# Altium footprint library Connectors.PcbLib: 114 footprints (part 3 of 8)
Each footprint in its own frame and in the unit in brackets; x right, y up, seen from the top. Pads: shape width x height; smd on the part's side, far side on the other; paste and mask are expansions set on the pad; w line width, h text height; cw(c..) or ccw(c..) is an arc to the next point about the centre after c.
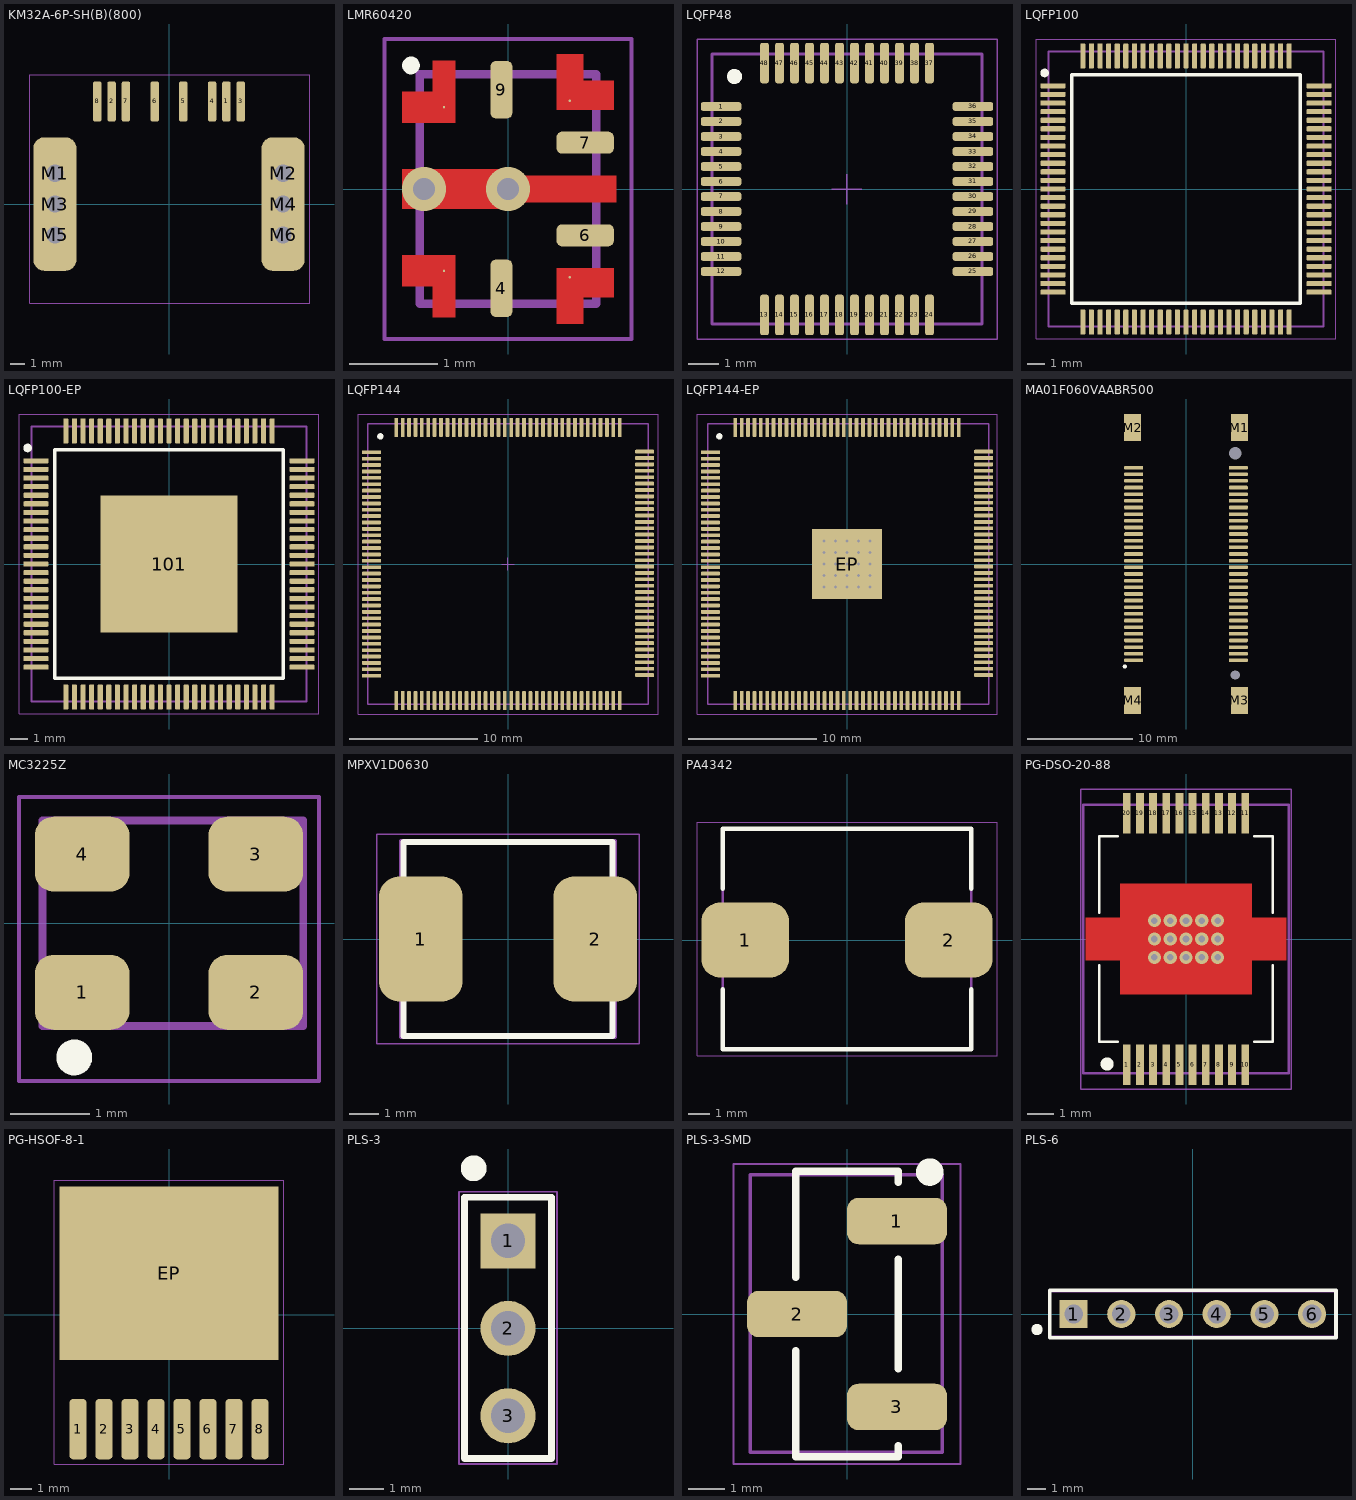
[diagram p2: the footprints below, top view; thin cyan lines are the x and y axes]

## KM32A-6P-SH(B)(800) [mm]
height 8.34
pads (14):
  rrect50% 0.6x2.8 smd: 1(4,7.15) 2(-4,7.15) 3(5,7.15) 4(3,7.15) 5(1,7.15) 6(-1,7.15) 7(-3,7.15) 8(-5,7.15)
  rrect50% 3x5 hole 1.2: M1(-7.95,2.15) M2(7.95,2.15) M3(-7.95,0) M4(7.95,0) M5(-7.95,-2.15) M6(7.95,-2.15)
Mechanical 15:
  lines w0.05: -9.7,-6.9 9.8,-6.9 9.8,9 -9.7,9 -9.7,-6.9
3D body "õqÉŠŒpZE05-8DP-2H.stp": height 8.84, standoff -2.1, extent -9.26,-6.6 9.26,8.2

## LMR60420 [mm] "9-PowerWQFN 2.5X2mm"
height 0.8
pads (9):
  round 0.025 smd: 1(-0.725,0.927) 2(0,0) 3(-0.725,-0.927) 5(0.7,-1) 8(0.7,1)
  rrect50% 0.25x0.65 smd: 4(-0.075,-1.125) 9(-0.075,1.125)
  rrect50% 0.65x0.25 smd: 6(0.875,-0.525) 7(0.875,0.525)
via 0,0 diameter 0.5 hole 0.25
via -0.95,0 diameter 0.5 hole 0.25
Top Layer:
  region: 0.55,-1.525 0.85,-1.525 0.85,-1.225 1.2,-1.225 1.2,-0.9 0.55,-0.9
  region: 0.55,1.525 0.85,1.525 0.85,1.225 1.2,1.225 1.2,0.9 0.55,0.9
  region: -1.2,1.102 -0.85,1.102 -0.85,1.452 -0.6,1.452 -0.6,0.752 -1.2,0.752
  region: -1.2,-1.102 -0.85,-1.102 -0.85,-1.452 -0.6,-1.452 -0.6,-0.752 -1.2,-0.752
  region: -1.2,0.225 -1.2,-0.225 0.1,-0.225 0.175,-0.15 1.225,-0.15 1.225,0.15 0.15,0.15 0.075,0.225
Top Overlay:
  circle w0.1: c-1.1,1.4 r0.05
Mechanical 13:
  lines w0.1: -1,-1.3 1,-1.3 1,1.3 -1,1.3 -1,-1.3
Mechanical 15:
  lines w0.05: -1.4,-1.7 1.4,-1.7 1.4,1.7 -1.4,1.7 -1.4,-1.7
3D body "RAK0009A.stp": height 0.8, standoff 0, extent -0.998,-1.205 1.002,1.295

## LQFP48 [mm] "48 Pin, Body 7x7x1.4"
height 1.4
pads (48):
  rrect50% 1.35x0.29 smd: 1(-4.2,2.75) 2(-4.2,2.25) 3(-4.2,1.75) 4(-4.2,1.25) 5(-4.2,0.75) 6(-4.2,0.25) 7(-4.2,-0.25) 8(-4.2,-0.75) 9(-4.2,-1.25) 10(-4.2,-1.75) 11(-4.2,-2.25) 12(-4.2,-2.75) 25(4.2,-2.75) 26(4.2,-2.25) 27(4.2,-1.75) 28(4.2,-1.25) 29(4.2,-0.75) 30(4.2,-0.25) 31(4.2,0.25) 32(4.2,0.75) 33(4.2,1.25) 34(4.2,1.75) 35(4.2,2.25) 36(4.2,2.75)
  rrect50% 0.29x1.35 smd: 13(-2.75,-4.2) 14(-2.25,-4.2) 15(-1.75,-4.2) 16(-1.25,-4.2) 17(-0.75,-4.2) 18(-0.25,-4.2) 19(0.25,-4.2) 20(0.75,-4.2) 21(1.25,-4.2) 22(1.75,-4.2) 23(2.25,-4.2) 24(2.75,-4.2) 37(2.75,4.2) 38(2.25,4.2) 39(1.75,4.2) 40(1.25,4.2) 41(0.75,4.2) 42(0.25,4.2) 43(-0.25,4.2) 44(-0.75,4.2) 45(-1.25,4.2) 46(-1.75,4.2) 47(-2.25,4.2) 48(-2.75,4.2)
Top Overlay:
  circle w0.25: c-3.75,3.75 r0.125
Mechanical 13:
  lines w0.1: -4.5,-4.5 -4.5,4.5 4.5,4.5 4.5,-4.5 -4.5,-4.5
Mechanical 15:
  lines w0.05: -0.5,0 0.5,0 ; 0,-0.5 0,0.5 ; -5,-5 -5,5 5,5 5,-5 -5,-5
3D body "LQFP48.STEP": height 1.5, standoff 0, extent -4.513,-4.513 4.513,4.513

## LQFP100 [mm] "Plastic low profile quad flat package; 100 leads; 0.5 mm pitch, 14 mm x 14 mm x 1.4 mm body"
height 1.4
pads (100):
  rrect50% 1.475x0.3 smd mask+0.05: 1(-7.738,6) 2(-7.738,5.5) 3(-7.738,5) 4(-7.738,4.5) 5(-7.738,4) 6(-7.738,3.5) 7(-7.738,3) 8(-7.738,2.5) 9(-7.738,2) 10(-7.738,1.5) 11(-7.738,1) 12(-7.738,0.5) 13(-7.738,0) 14(-7.738,-0.5) 15(-7.738,-1) 16(-7.738,-1.5) 17(-7.738,-2) 18(-7.738,-2.5) 19(-7.738,-3) 20(-7.738,-3.5) 21(-7.738,-4) 22(-7.738,-4.5) 23(-7.738,-5) 24(-7.738,-5.5) 25(-7.738,-6) 51(7.738,-6) 52(7.738,-5.5) 53(7.738,-5) 54(7.738,-4.5) 55(7.738,-4) 56(7.738,-3.5) 57(7.738,-3) 58(7.738,-2.5) 59(7.738,-2) 60(7.738,-1.5) 61(7.738,-1) 62(7.738,-0.5) 63(7.738,0) 64(7.738,0.5) 65(7.738,1) 66(7.738,1.5) 67(7.738,2) 68(7.738,2.5) 69(7.738,3) 70(7.738,3.5) 71(7.738,4) 72(7.738,4.5) 73(7.738,5) 74(7.738,5.5) 75(7.738,6)
  rrect50% 0.3x1.475 smd mask+0.05: 26(-6,-7.738) 27(-5.5,-7.738) 28(-5,-7.738) 29(-4.5,-7.738) 30(-4,-7.738) 31(-3.5,-7.738) 32(-3,-7.738) 33(-2.5,-7.738) 34(-2,-7.738) 35(-1.5,-7.738) 36(-1,-7.738) 37(-0.5,-7.738) 38(0,-7.738) 39(0.5,-7.738) 40(1,-7.738) 41(1.5,-7.738) 42(2,-7.738) 43(2.5,-7.738) 44(3,-7.738) 45(3.5,-7.738) 46(4,-7.738) 47(4.5,-7.738) 48(5,-7.738) 49(5.5,-7.738) 50(6,-7.738) 76(6,7.738) 77(5.5,7.738) 78(5,7.738) 79(4.5,7.738) 80(4,7.738) 81(3.5,7.738) 82(3,7.738) 83(2.5,7.738) 84(2,7.738) 85(1.5,7.738) 86(1,7.738) 87(0.5,7.738) 88(0,7.738) 89(-0.5,7.738) 90(-1,7.738) 91(-1.5,7.738) 92(-2,7.738) 93(-2.5,7.738) 94(-3,7.738) 95(-3.5,7.738) 96(-4,7.738) 97(-4.5,7.738) 98(-5,7.738) 99(-5.5,7.738) 100(-6,7.738)
Top Overlay:
  circle w0.25: c-8.225,6.75 r0.125
  lines w0.2: -6.65,-6.65 6.65,-6.65 6.65,6.65 -6.65,6.65 -6.65,-6.65
Mechanical 13:
  lines w0.1: -8,-8 8,-8 8,8 -8,8 -8,-8
Mechanical 15:
  lines w0.05: -8.725,-8.725 8.725,-8.725 8.725,8.725 -8.725,8.725 -8.725,-8.725
3D body "ATSAME70N20A-ANT.stp": height 1.6, standoff 0, extent -8,-8 8,8

## LQFP100-EP [mm] "Plastic low profile quad flat package; 100 leads; 0.5 mm pitch, 14 mm x 14 mm x 1.4 mm body; 100-LQFP Exposed Pad"
height 1.4
pads (101):
  rrect50% 1.475x0.3 smd mask+0.05: 1(-7.738,6) 2(-7.738,5.5) 3(-7.738,5) 4(-7.738,4.5) 5(-7.738,4) 6(-7.738,3.5) 7(-7.738,3) 8(-7.738,2.5) 9(-7.738,2) 10(-7.738,1.5) 11(-7.738,1) 12(-7.738,0.5) 13(-7.738,0) 14(-7.738,-0.5) 15(-7.738,-1) 16(-7.738,-1.5) 17(-7.738,-2) 18(-7.738,-2.5) 19(-7.738,-3) 20(-7.738,-3.5) 21(-7.738,-4) 22(-7.738,-4.5) 23(-7.738,-5) 24(-7.738,-5.5) 25(-7.738,-6) 51(7.738,-6) 52(7.738,-5.5) 53(7.738,-5) 54(7.738,-4.5) 55(7.738,-4) 56(7.738,-3.5) 57(7.738,-3) 58(7.738,-2.5) 59(7.738,-2) 60(7.738,-1.5) 61(7.738,-1) 62(7.738,-0.5) 63(7.738,0) 64(7.738,0.5) 65(7.738,1) 66(7.738,1.5) 67(7.738,2) 68(7.738,2.5) 69(7.738,3) 70(7.738,3.5) 71(7.738,4) 72(7.738,4.5) 73(7.738,5) 74(7.738,5.5) 75(7.738,6)
  rrect50% 0.3x1.475 smd mask+0.05: 26(-6,-7.738) 27(-5.5,-7.738) 28(-5,-7.738) 29(-4.5,-7.738) 30(-4,-7.738) 31(-3.5,-7.738) 32(-3,-7.738) 33(-2.5,-7.738) 34(-2,-7.738) 35(-1.5,-7.738) 36(-1,-7.738) 37(-0.5,-7.738) 38(0,-7.738) 39(0.5,-7.738) 40(1,-7.738) 41(1.5,-7.738) 42(2,-7.738) 43(2.5,-7.738) 44(3,-7.738) 45(3.5,-7.738) 46(4,-7.738) 47(4.5,-7.738) 48(5,-7.738) 49(5.5,-7.738) 50(6,-7.738) 76(6,7.738) 77(5.5,7.738) 78(5,7.738) 79(4.5,7.738) 80(4,7.738) 81(3.5,7.738) 82(3,7.738) 83(2.5,7.738) 84(2,7.738) 85(1.5,7.738) 86(1,7.738) 87(0.5,7.738) 88(0,7.738) 89(-0.5,7.738) 90(-1,7.738) 91(-1.5,7.738) 92(-2,7.738) 93(-2.5,7.738) 94(-3,7.738) 95(-3.5,7.738) 96(-4,7.738) 97(-4.5,7.738) 98(-5,7.738) 99(-5.5,7.738) 100(-6,7.738)
  rect 7.95x7.95 smd paste-10 mask+0.102: 101(0,0)
Top Overlay:
  circle w0.25: c-8.225,6.75 r0.125
  lines w0.2: -6.65,-6.65 6.65,-6.65 6.65,6.65 -6.65,6.65 -6.65,-6.65
Top Paste:
  rectangle: -3.975,-3.975 -2.705,-2.705
  rectangle: -2.305,-3.975 -1.035,-2.705
  rectangle: -0.635,-3.975 0.635,-2.705
  rectangle: 1.035,-3.975 2.305,-2.705
  rectangle: 2.705,-3.975 3.975,-2.705
  region: -2.705,-2.305 -2.705,-1.035 -3.975,-1.035 -3.975,-2.305
  region: -1.035,-2.305 -1.035,-1.035 -2.305,-1.035 -2.305,-2.305
  region: 0.635,-2.305 0.635,-1.035 -0.635,-1.035 -0.635,-2.305
  region: 2.305,-2.305 2.305,-1.035 1.035,-1.035 1.035,-2.305
  region: 3.975,-2.305 3.975,-1.035 2.705,-1.035 2.705,-2.305
  region: -2.705,-0.635 -2.705,0.635 -3.975,0.635 -3.975,-0.635
  region: -1.035,-0.635 -1.035,0.635 -2.305,0.635 -2.305,-0.635
  region: 0.635,-0.635 0.635,0.635 -0.635,0.635 -0.635,-0.635
  region: 2.305,-0.635 2.305,0.635 1.035,0.635 1.035,-0.635
  region: 3.975,-0.634 3.975,0.636 2.705,0.636 2.705,-0.634
  region: -2.705,1.035 -2.705,2.305 -3.975,2.305 -3.975,1.035
  region: -1.035,1.035 -1.035,2.305 -2.305,2.305 -2.305,1.035
  region: 0.635,1.035 0.635,2.305 -0.635,2.305 -0.635,1.035
  region: 2.305,1.036 2.305,2.306 1.035,2.306 1.035,1.036
  region: 3.975,1.036 3.975,2.306 2.705,2.306 2.705,1.036
  region: -2.705,2.705 -2.705,3.975 -3.975,3.975 -3.975,2.705
  region: -1.035,2.705 -1.035,3.975 -2.305,3.975 -2.305,2.705
  region: 0.635,2.706 0.635,3.976 -0.635,3.976 -0.635,2.706
  region: 2.305,2.706 2.305,3.976 1.035,3.976 1.035,2.706
  region: 3.975,2.706 3.975,3.976 2.705,3.976 2.705,2.706
Top Solder:
  rectangle: 2.705,-3.975 3.975,-2.705
  rectangle: -3.975,-3.975 -2.705,-2.705
  rectangle: -2.305,-3.975 -1.035,-2.705
  rectangle: -0.635,-3.975 0.635,-2.705
  rectangle: 1.035,-3.975 2.305,-2.705
  region: -2.705,-2.305 -2.705,-1.035 -3.975,-1.035 -3.975,-2.305
  region: -1.035,-2.305 -1.035,-1.035 -2.305,-1.035 -2.305,-2.305
  region: 0.635,-2.305 0.635,-1.035 -0.635,-1.035 -0.635,-2.305
  region: 2.305,-2.305 2.305,-1.035 1.035,-1.035 1.035,-2.305
  region: 3.975,-2.305 3.975,-1.035 2.705,-1.035 2.705,-2.305
  region: -2.705,2.705 -2.705,3.975 -3.975,3.975 -3.975,2.705
  region: -1.035,2.705 -1.035,3.975 -2.305,3.975 -2.305,2.705
  region: 0.635,2.706 0.635,3.976 -0.635,3.976 -0.635,2.706
  region: 2.305,2.706 2.305,3.976 1.035,3.976 1.035,2.706
  region: 3.975,2.706 3.975,3.976 2.705,3.976 2.705,2.706
  region: -2.705,-0.635 -2.705,0.635 -3.975,0.635 -3.975,-0.635
  region: -1.035,-0.635 -1.035,0.635 -2.305,0.635 -2.305,-0.635
  region: 0.635,-0.635 0.635,0.635 -0.635,0.635 -0.635,-0.635
  region: 2.305,-0.635 2.305,0.635 1.035,0.635 1.035,-0.635
  region: 3.975,-0.634 3.975,0.636 2.705,0.636 2.705,-0.634
  region: -2.705,1.035 -2.705,2.305 -3.975,2.305 -3.975,1.035
  region: -1.035,1.035 -1.035,2.305 -2.305,2.305 -2.305,1.035
  region: 0.635,1.035 0.635,2.305 -0.635,2.305 -0.635,1.035
  region: 2.305,1.036 2.305,2.306 1.035,2.306 1.035,1.036
  region: 3.975,1.036 3.975,2.306 2.705,2.306 2.705,1.036
Mechanical 13:
  lines w0.1: -8.001,-8.001 8.001,-8.001 8.001,8.001 -8.001,8.001 -8.001,-8.001
Mechanical 15:
  lines w0.05: -8.725,-8.725 8.725,-8.725 8.725,8.725 -8.725,8.725 -8.725,-8.725
3D body "LQFP100_14X14X1P4_EP7P6X7P6_STM.step": height 1.6, standoff 0, extent -8.001,-8.001 8.001,8.001

## LQFP144 [mm] "144-Lead Plastic Thin Quad Flat Pack, 20x20mm"
height 1
pads (144):
  rrect50% 1.5x0.3 smd: 1(-10.7,8.75) 2(-10.7,8.25) 3(-10.7,7.75) 4(-10.7,7.25) 5(-10.7,6.75) 6(-10.7,6.25) 7(-10.7,5.75) 8(-10.7,5.25) 9(-10.7,4.75) 10(-10.7,4.25) 11(-10.7,3.75) 12(-10.7,3.25) 13(-10.7,2.75) 14(-10.7,2.25) 15(-10.7,1.75) 16(-10.7,1.25) 17(-10.7,0.75) 18(-10.7,0.25) 19(-10.7,-0.25) 20(-10.7,-0.75) 21(-10.7,-1.25) 22(-10.7,-1.75) 23(-10.7,-2.25) 24(-10.7,-2.75) 25(-10.7,-3.25) 26(-10.7,-3.75) 27(-10.7,-4.25) 28(-10.7,-4.75) 29(-10.7,-5.25) 30(-10.7,-5.75) 31(-10.7,-6.25) 32(-10.7,-6.75) 33(-10.7,-7.25) 34(-10.7,-7.75) 35(-10.7,-8.25) 36(-10.7,-8.75) 73(10.7,-8.7) 74(10.7,-8.2) 75(10.7,-7.7) 76(10.7,-7.2) 77(10.7,-6.7) 78(10.7,-6.2) 79(10.7,-5.7) 80(10.7,-5.2) 81(10.7,-4.7) 82(10.7,-4.2) 83(10.7,-3.7) 84(10.7,-3.2) 85(10.7,-2.7) 86(10.7,-2.2) 87(10.7,-1.7) 88(10.7,-1.2) 89(10.7,-0.7) 90(10.7,-0.2) 91(10.7,0.3) 92(10.7,0.8) 93(10.7,1.3) 94(10.7,1.8) 95(10.7,2.3) 96(10.7,2.8) 97(10.7,3.3) 98(10.7,3.8) 99(10.7,4.3) 100(10.7,4.8) 101(10.7,5.3) 102(10.7,5.8) 103(10.7,6.3) 104(10.7,6.8) 105(10.7,7.3) 106(10.7,7.8) 107(10.7,8.3) 108(10.7,8.8)
  rrect50% 0.3x1.5 smd: 37(-8.75,-10.7) 38(-8.25,-10.7) 39(-7.75,-10.7) 40(-7.25,-10.7) 41(-6.75,-10.7) 42(-6.25,-10.7) 43(-5.75,-10.7) 44(-5.25,-10.7) 45(-4.75,-10.7) 46(-4.25,-10.7) 47(-3.75,-10.7) 48(-3.25,-10.7) 49(-2.75,-10.7) 50(-2.25,-10.7) 51(-1.75,-10.7) 52(-1.25,-10.7) 53(-0.75,-10.7) 54(-0.25,-10.7) 55(0.25,-10.7) 56(0.75,-10.7) 57(1.25,-10.7) 58(1.75,-10.7) 59(2.25,-10.7) 60(2.75,-10.7) 61(3.25,-10.7) 62(3.75,-10.7) 63(4.25,-10.7) 64(4.75,-10.7) 65(5.25,-10.7) 66(5.75,-10.7) 67(6.25,-10.7) 68(6.75,-10.7) 69(7.25,-10.7) 70(7.75,-10.7) 71(8.25,-10.7) 72(8.75,-10.7) 109(8.75,10.7) 110(8.25,10.7) 111(7.75,10.7) 112(7.25,10.7) 113(6.75,10.7) 114(6.25,10.7) 115(5.75,10.7) 116(5.25,10.7) 117(4.75,10.7) 118(4.25,10.7) 119(3.75,10.7) 120(3.25,10.7) 121(2.75,10.7) 122(2.25,10.7) 123(1.75,10.7) 124(1.25,10.7) 125(0.75,10.7) 126(0.25,10.7) 127(-0.25,10.7) 128(-0.75,10.7) 129(-1.25,10.7) 130(-1.75,10.7) 131(-2.25,10.7) 132(-2.75,10.7) 133(-3.25,10.7) 134(-3.75,10.7) 135(-4.25,10.7) 136(-4.75,10.7) 137(-5.25,10.7) 138(-5.75,10.7) 139(-6.25,10.7) 140(-6.75,10.7) 141(-7.25,10.7) 142(-7.75,10.7) 143(-8.25,10.7) 144(-8.75,10.7)
Top Overlay:
  circle w0.25: c-10,10 r0.125
Mechanical 13:
  lines w0.1: -11,-11 -11,11 11,11 11,-11 -11,-11
Mechanical 15:
  lines w0.05: -0.5,0 0.5,0 ; 0,-0.5 0,0.5 ; -11.75,-11.75 -11.75,11.75 11.75,11.75 11.75,-11.75 -11.75,-11.75
3D body "LQFP-144pin.SLDPRT": height 1.65, standoff 0.05, extent -11,-11 11,11

## LQFP144-EP [mm] "144-Lead Plastic Thin Quad Flat Pack with epad, 20x20mm"
height 1
pads (145):
  rrect50% 1.5x0.3 smd: 1(-10.7,8.75) 2(-10.7,8.25) 3(-10.7,7.75) 4(-10.7,7.25) 5(-10.7,6.75) 6(-10.7,6.25) 7(-10.7,5.75) 8(-10.7,5.25) 9(-10.7,4.75) 10(-10.7,4.25) 11(-10.7,3.75) 12(-10.7,3.25) 13(-10.7,2.75) 14(-10.7,2.25) 15(-10.7,1.75) 16(-10.7,1.25) 17(-10.7,0.75) 18(-10.7,0.25) 19(-10.7,-0.25) 20(-10.7,-0.75) 21(-10.7,-1.25) 22(-10.7,-1.75) 23(-10.7,-2.25) 24(-10.7,-2.75) 25(-10.7,-3.25) 26(-10.7,-3.75) 27(-10.7,-4.25) 28(-10.7,-4.75) 29(-10.7,-5.25) 30(-10.7,-5.75) 31(-10.7,-6.25) 32(-10.7,-6.75) 33(-10.7,-7.25) 34(-10.7,-7.75) 35(-10.7,-8.25) 36(-10.7,-8.75) 73(10.7,-8.7) 74(10.7,-8.2) 75(10.7,-7.7) 76(10.7,-7.2) 77(10.7,-6.7) 78(10.7,-6.2) 79(10.7,-5.7) 80(10.7,-5.2) 81(10.7,-4.7) 82(10.7,-4.2) 83(10.7,-3.7) 84(10.7,-3.2) 85(10.7,-2.7) 86(10.7,-2.2) 87(10.7,-1.7) 88(10.7,-1.2) 89(10.7,-0.7) 90(10.7,-0.2) 91(10.7,0.3) 92(10.7,0.8) 93(10.7,1.3) 94(10.7,1.8) 95(10.7,2.3) 96(10.7,2.8) 97(10.7,3.3) 98(10.7,3.8) 99(10.7,4.3) 100(10.7,4.8) 101(10.7,5.3) 102(10.7,5.8) 103(10.7,6.3) 104(10.7,6.8) 105(10.7,7.3) 106(10.7,7.8) 107(10.7,8.3) 108(10.7,8.8)
  rrect50% 0.3x1.5 smd: 37(-8.75,-10.7) 38(-8.25,-10.7) 39(-7.75,-10.7) 40(-7.25,-10.7) 41(-6.75,-10.7) 42(-6.25,-10.7) 43(-5.75,-10.7) 44(-5.25,-10.7) 45(-4.75,-10.7) 46(-4.25,-10.7) 47(-3.75,-10.7) 48(-3.25,-10.7) 49(-2.75,-10.7) 50(-2.25,-10.7) 51(-1.75,-10.7) 52(-1.25,-10.7) 53(-0.75,-10.7) 54(-0.25,-10.7) 55(0.25,-10.7) 56(0.75,-10.7) 57(1.25,-10.7) 58(1.75,-10.7) 59(2.25,-10.7) 60(2.75,-10.7) 61(3.25,-10.7) 62(3.75,-10.7) 63(4.25,-10.7) 64(4.75,-10.7) 65(5.25,-10.7) 66(5.75,-10.7) 67(6.25,-10.7) 68(6.75,-10.7) 69(7.25,-10.7) 70(7.75,-10.7) 71(8.25,-10.7) 72(8.75,-10.7) 109(8.75,10.7) 110(8.25,10.7) 111(7.75,10.7) 112(7.25,10.7) 113(6.75,10.7) 114(6.25,10.7) 115(5.75,10.7) 116(5.25,10.7) 117(4.75,10.7) 118(4.25,10.7) 119(3.75,10.7) 120(3.25,10.7) 121(2.75,10.7) 122(2.25,10.7) 123(1.75,10.7) 124(1.25,10.7) 125(0.75,10.7) 126(0.25,10.7) 127(-0.25,10.7) 128(-0.75,10.7) 129(-1.25,10.7) 130(-1.75,10.7) 131(-2.25,10.7) 132(-2.75,10.7) 133(-3.25,10.7) 134(-3.75,10.7) 135(-4.25,10.7) 136(-4.75,10.7) 137(-5.25,10.7) 138(-5.75,10.7) 139(-6.25,10.7) 140(-6.75,10.7) 141(-7.25,10.7) 142(-7.75,10.7) 143(-8.25,10.7) 144(-8.75,10.7)
  rect 5.5x5.5 smd: EP(0,0)
via -1.8,0.9 diameter 0.5 hole 0.25
via -1.8,1.8 diameter 0.5 hole 0.25
via -1.8,0 diameter 0.5 hole 0.25
via -1.8,-0.9 diameter 0.5 hole 0.25
via -1.8,-1.8 diameter 0.5 hole 0.25
via -0.9,0.9 diameter 0.5 hole 0.25
via -0.9,1.8 diameter 0.5 hole 0.25
via -0.9,0 diameter 0.5 hole 0.25
via -0.9,-0.9 diameter 0.5 hole 0.25
via -0.9,-1.8 diameter 0.5 hole 0.25
via 0,0.9 diameter 0.5 hole 0.25
via 0,1.8 diameter 0.5 hole 0.25
via 0.007,0.003 diameter 0.5 hole 0.25
via 0,-0.9 diameter 0.5 hole 0.25
via 0,-1.8 diameter 0.5 hole 0.25
via 0.9,0.9 diameter 0.5 hole 0.25
via 0.9,1.8 diameter 0.5 hole 0.25
via 0.9,0 diameter 0.5 hole 0.25
via 0.9,-0.9 diameter 0.5 hole 0.25
via 0.9,-1.8 diameter 0.5 hole 0.25
via 1.8,0.9 diameter 0.5 hole 0.25
via 1.8,1.8 diameter 0.5 hole 0.25
via 1.8,0 diameter 0.5 hole 0.25
via 1.8,-0.9 diameter 0.5 hole 0.25
via 1.8,-1.8 diameter 0.5 hole 0.25
Top Overlay:
  circle w0.25: c-10,10 r0.125
Mechanical 13:
  lines w0.1: -10.9,-11 -10.9,11 11.1,11 11.1,-11 -10.9,-11
Mechanical 15:
  lines w0.05: -0.5,0 0.5,0 ; 0,-0.5 0,0.5 ; -11.75,-11.75 -11.75,11.75 11.75,11.75 11.75,-11.75 -11.75,-11.75
3D body "LQFP-144pin.SLDPRT": height 1.65, standoff 0.05, extent -10.9,-11 11.1,11

## MA01F060VAABR500 [mm]
pads (66):
  round 0 hole 0.9 unplated: 0(4.7,-10.597)
  round 0 hole 1.2 unplated: 0(4.7,10.597)
  rrect50% 1.8x0.35 smd mask+0.05: 1(-5,-9.207) 2(-5,-8.572) 3(-5,-7.938) 4(-5,-7.302) 5(-5,-6.667) 6(-5,-6.032) 7(-5,-5.397) 8(-5,-4.763) 9(-5,-4.127) 10(-5,-3.492) 11(-5,-2.857) 12(-5,-2.222) 13(-5,-1.587) 14(-5,-0.953) 15(-5,-0.318) 16(-5,0.318) 17(-5,0.953) 18(-5,1.587) 19(-5,2.222) 20(-5,2.857) 21(-5,3.492) 22(-5,4.127) 23(-5,4.763) 24(-5,5.397) 25(-5,6.032) 26(-5,6.667) 27(-5,7.302) 28(-5,7.938) 29(-5,8.572) 30(-5,9.207) 31(5,-9.207) 32(5,-8.572) 33(5,-7.938) 34(5,-7.302) 35(5,-6.667) 36(5,-6.032) 37(5,-5.397) 38(5,-4.763) 39(5,-4.127) 40(5,-3.492) 41(5,-2.857) 42(5,-2.222) 43(5,-1.587) 44(5,-0.953) 45(5,-0.318) 46(5,0.318) 47(5,0.953) 48(5,1.587) 49(5,2.222) 50(5,2.857) 51(5,3.492) 52(5,4.127) 53(5,4.763) 54(5,5.397) 55(5,6.032) 56(5,6.667) 57(5,7.302) 58(5,7.938) 59(5,8.572) 60(5,9.207)
  rect 1.6x2.6 smd mask+0.05: M1(5.1,13.025) M2(-5.1,13.025) M3(5.1,-13.025) M4(-5.1,-13.025)
Top Overlay:
  circle w0.2: c-5.842,-9.779 r0.1
3D body "MA01F060VAABR500.stp": height 6.3, standoff -0.7, extent -5.606,-15.225 5.606,15.225

## MC3225Z [mm] "0.126\" L x 0.098\" W (3.20mm x 2.50mm)"
height 0.8
pads (4):
  rrect50% 1.2x0.95 smd: 1(-1.1,-0.875) 2(1.1,-0.875) 3(1.1,0.875) 4(-1.1,0.875)
Top Overlay:
  circle w0.254: c-1.2,-1.7 r0.1
Mechanical 13:
  lines w0.1: -1.6,-1.3 1.7,-1.3 1.7,1.3 -1.6,1.3 -1.6,-1.3
Mechanical 15:
  lines w0.05: -1.9,-2 -1.9,1.6 1.9,1.6 1.9,-2 -1.9,-2
3D body "MC3225Z.step": height 0.74, standoff -0.01, extent -1.558,-1.249 1.642,1.251

## MPXV1D0630 [mm] "6 mm x 6 mm x 3 mm Power inductor case"
height 3
pads (2):
  rrect50% 2.8x4.2 smd: 1(-2.921,0) 2(2.921,0)
Top Overlay:
  lines w0.2: -3.5,-2.1 -3.5,-3.25 3.5,-3.25 3.5,-2.1 ; -3.5,2.1 -3.5,3.25 3.5,3.25 3.5,2.1
Mechanical 13:
  lines w0.1: -3.6,-3.3 3.6,-3.3 3.6,3.3 -3.6,3.3 -3.6,-3.3
Mechanical 15:
  lines w0.05: -4.4,-3.5 -4.4,3.5 4.4,3.5 4.4,-3.5 -4.4,-3.5
3D body "MPXV1D0630L1R0.stp": height 3, standoff -0.06, extent -3.625,-3.35 3.625,3.35

## PA4342 [mm] "0.453\" L x 0.406\" W (11.50mm x 10.30mm)"
height 4
pads (2):
  rrect50% 4.1x3.5 smd: 1(-4.75,0) 2(4.75,0)
Top Overlay:
  lines w0.2: -5.8,-2.3 -5.8,-5.1 5.8,-5.1 5.8,-2.3 ; -5.8,2.4 -5.8,5.2 5.8,5.2 5.8,2.4
Mechanical 13:
  lines w0.1: -5.8,-5.1 -5.8,5.2 5.8,5.2 5.8,-5.1 -5.8,-5.1
Mechanical 15:
  lines w0.05: -7,-5.4 7,-5.4 7,5.5 -7,5.5 -7,-5.4
3D body "User Library-L-SMD_Pulse_electronic_PA4342_XXXNLT_series__Footprint1.step": height 4, standoff 0, extent -5.75,-5.15 5.75,5.15

## PG-DSO-20-88 [mm] "7.8 L x 7.5 mm"
height 2.6
pads (21):
  rect 0.3x1.55 smd paste-2539.97: 1(-2.25,-4.775) 2(-1.75,-4.775) 3(-1.25,-4.775) 4(-0.75,-4.775) 5(-0.25,-4.775) 6(0.25,-4.775) 7(0.75,-4.775) 8(1.25,-4.775) 9(1.75,-4.775) 10(2.25,-4.775) 11(2.25,4.775) 12(1.75,4.775) 13(1.25,4.775) 14(0.75,4.775) 15(0.25,4.775) 16(-0.25,4.775) 17(-0.75,4.775) 18(-1.25,4.775) 19(-1.75,4.775) 20(-2.25,4.775)
  round 0.025 smd paste-100: EP(0,0)
via 0.6,0 diameter 0.5 hole 0.25
via 0,0 diameter 0.5 hole 0.25
via -0.6,0 diameter 0.5 hole 0.25
via 1.2,-0.7 diameter 0.5 hole 0.25
via 0.6,-0.7 diameter 0.5 hole 0.25
via 0,-0.7 diameter 0.5 hole 0.25
via -0.6,-0.7 diameter 0.5 hole 0.25
via -1.2,-0.7 diameter 0.5 hole 0.25
via -0.6,0.7 diameter 0.5 hole 0.25
via 1.2,0.7 diameter 0.5 hole 0.25
via 0.6,0.7 diameter 0.5 hole 0.25
via -1.2,0.7 diameter 0.5 hole 0.25
via 0,0.7 diameter 0.5 hole 0.25
via 1.2,0 diameter 0.5 hole 0.25
via -1.2,0 diameter 0.5 hole 0.25
Top Layer:
  region: -3.8,-0.8 -3.8,0.8 -2.5,0.8 -2.5,2.1 2.5,2.1 2.5,0.8 3.8,0.8 3.8,-0.8 2.5,-0.8 2.5,-2.1 -2.5,-2.1 -2.5,-0.8
Top Overlay:
  circle w0.25: c-3,-4.75 r0.125
  lines w0.1: -3.3,-1 -3.3,-3.9 -2.6,-3.9 ; -3.3,1 -3.3,3.9 -2.6,3.9 ; 2.6,-3.9 3.3,-3.9 3.3,-1 ; 2.6,3.9 3.3,3.9 3.3,1
Top Paste:
  rectangle: -1.1,-0.5 1.1,0.5
  rectangle: -3.5,-0.5 -1.3,0.5
  rectangle: 1.3,-0.5 3.5,0.5
  rectangle: -2.3,-1.8 -0.1,-0.8
  rectangle: 0.1,-1.8 2.3,-0.8
  rectangle: -2.3,0.8 -0.1,1.8
  rectangle: 0.1,0.8 2.3,1.8
  region: 2.12,-5.53 2.12,-4.02 2.38,-4.02 2.38,-5.53
  region: 2.12,4.02 2.12,5.53 2.38,5.53 2.38,4.02
  region: 1.62,4.02 1.62,5.53 1.88,5.53 1.88,4.02
  region: 1.12,4.02 1.12,5.53 1.38,5.53 1.38,4.02
  region: 0.62,4.02 0.62,5.53 0.88,5.53 0.88,4.02
  region: 0.12,4.02 0.12,5.53 0.38,5.53 0.38,4.02
  region: -0.38,4.02 -0.38,5.53 -0.12,5.53 -0.12,4.02
  region: -0.88,4.02 -0.88,5.53 -0.62,5.53 -0.62,4.02
  region: -1.38,4.02 -1.38,5.53 -1.12,5.53 -1.12,4.02
  region: -1.88,4.02 -1.88,5.53 -1.62,5.53 -1.62,4.02
  region: -2.38,4.02 -2.38,5.53 -2.12,5.53 -2.12,4.02
  region: -2.38,-5.53 -2.38,-4.02 -2.12,-4.02 -2.12,-5.53
  region: -1.88,-5.53 -1.88,-4.02 -1.62,-4.02 -1.62,-5.53
  region: -1.38,-5.53 -1.38,-4.02 -1.12,-4.02 -1.12,-5.53
  region: -0.88,-5.53 -0.88,-4.02 -0.62,-4.02 -0.62,-5.53
  region: -0.38,-5.53 -0.38,-4.02 -0.12,-4.02 -0.12,-5.53
  region: 0.12,-5.53 0.12,-4.02 0.38,-4.02 0.38,-5.53
  region: 0.62,-5.53 0.62,-4.02 0.88,-4.02 0.88,-5.53
  region: 1.12,-5.53 1.12,-4.02 1.38,-4.02 1.38,-5.53
  region: 1.62,-5.53 1.62,-4.02 1.88,-4.02 1.88,-5.53
Mechanical 13:
  lines w0.1: -3.9,-5.1 -3.9,5.1 3.9,5.1 3.9,-5.1 -3.9,-5.1
Mechanical 15:
  lines w0.05: -0.25,0 0.25,0 ; 0,-0.25 0,0.25 ; -4,-5.7 4,-5.7 4,5.7 -4,5.7 -4,-5.7
3D body "IC_Infineon_TLE9104SHXUMA1_eec.STEP": height 0.25, standoff 0, extent -4,-5.65 4,5.65

## PG-HSOF-8-1 [mm] "PG-HSOF-8 (8-pin TO-Leadless) package 10X10mm"
height 2.3
pads (9):
  rrect50% 0.8x2.8 smd: 1(-4.2,-5.29) 2(-3,-5.29) 3(-1.8,-5.29) 4(-0.6,-5.29) 5(0.6,-5.29) 6(1.8,-5.29) 7(3,-5.29) 8(4.2,-5.29)
  rect 10.1x8 smd paste-100: EP(0,1.9)
Top Paste:
  region: 2.2,-1.4 1.2,-1.4 1.2,-0.9 3.2,-0.9 3.2,-1.4
  region: 2.2,-0.7 1.2,-0.7 1.2,-0.2 3.2,-0.2 3.2,-0.7
  region: 2.2,4.9 1.2,4.9 1.2,5.4 3.2,5.4 3.2,4.9
  region: 2.2,4.2 1.2,4.2 1.2,4.7 3.2,4.7 3.2,4.2
  region: 2.2,3.5 1.2,3.5 1.2,4 3.2,4 3.2,3.5
  region: 2.2,2.8 1.2,2.8 1.2,3.3 3.2,3.3 3.2,2.8
  region: 2.2,2.1 1.2,2.1 1.2,2.6 3.2,2.6 3.2,2.1
  region: 2.2,1.4 1.2,1.4 1.2,1.9 3.2,1.9 3.2,1.4
  region: 2.2,0.7 1.2,0.7 1.2,1.2 3.2,1.2 3.2,0.7
  region: 2.2,0 1.2,0 1.2,0.5 3.2,0.5 3.2,0
  region: -2.2,-1.4 -3.2,-1.4 -3.2,-0.9 -1.2,-0.9 -1.2,-1.4
  region: -2.2,-0.7 -3.2,-0.7 -3.2,-0.2 -1.2,-0.2 -1.2,-0.7
  region: -2.2,4.9 -3.2,4.9 -3.2,5.4 -1.2,5.4 -1.2,4.9
  region: -2.2,4.2 -3.2,4.2 -3.2,4.7 -1.2,4.7 -1.2,4.2
  region: -2.2,3.5 -3.2,3.5 -3.2,4 -1.2,4 -1.2,3.5
  region: -2.2,2.8 -3.2,2.8 -3.2,3.3 -1.2,3.3 -1.2,2.8
  region: -2.2,2.1 -3.2,2.1 -3.2,2.6 -1.2,2.6 -1.2,2.1
  region: -2.2,1.4 -3.2,1.4 -3.2,1.9 -1.2,1.9 -1.2,1.4
  region: -2.2,0.7 -3.2,0.7 -3.2,1.2 -1.2,1.2 -1.2,0.7
  region: -2.2,0 -3.2,0 -3.2,0.5 -1.2,0.5 -1.2,0
  region: 0,-1.4 -1,-1.4 -1,-0.9 1,-0.9 1,-1.4
  region: 0,-0.7 -1,-0.7 -1,-0.2 1,-0.2 1,-0.7
  region: 0,4.9 -1,4.9 -1,5.4 1,5.4 1,4.9
  region: 0,4.2 -1,4.2 -1,4.7 1,4.7 1,4.2
  region: 0,3.5 -1,3.5 -1,4 1,4 1,3.5
  region: 0,2.8 -1,2.8 -1,3.3 1,3.3 1,2.8
  region: 0,2.1 -1,2.1 -1,2.6 1,2.6 1,2.1
  region: 0,1.4 -1,1.4 -1,1.9 1,1.9 1,1.4
  region: 0,0.7 -1,0.7 -1,1.2 1,1.2 1,0.7
  region: 0,0 -1,0 -1,0.5 1,0.5 1,0
Mechanical 13:
  lines w0.1: -2,-2 -2,2 2,2 2,-2 -2,-2
Mechanical 15:
  lines w0.05: -0.5,0 0.5,0 ; 0,-0.5 0,0.5 ; -5.3,-6.9 -5.3,6.2 5.3,6.2 5.3,-6.9 -5.3,-6.9
3D body "https___www.infineon.com_assets_row_public_packages_73_3d_model_infineon-pg-hsof-8-1-3d-02-stp-package-en.stp": height 2.31, standoff 0, extent -4.95,-5.837 4.95,5.837

## PLS-3 [mm] "Connector Header Through Hole 3 position 0.100\" (2.54mm)"
height 8.6
pads (3):
  rect 1.6x1.6 hole 1: 1(0,2.54)
  round 1.6 hole 1: 2(0,0) 3(0,-2.54)
Top Overlay:
  circle w0.5: c-0.995,4.645 r0.125
  lines w0.2: -1.264,-3.78 1.264,-3.78 1.264,3.804 -1.264,3.804 -1.264,-3.78
Mechanical 13:
  lines w0.1: -1.27,-3.78 -1.27,3.81 1.27,3.81 1.27,-3.78 -1.27,-3.78
Mechanical 15:
  lines w0.05: -1.422,-3.938 -1.422,3.962 1.422,3.962 1.422,-3.938 -1.422,-3.938
3D body "PLS-3_(DS1021_CONNFLY).stp": height 8.75, standoff -2.95, extent -1.27,-3.81 1.27,3.81

## PLS-3-SMD [mm] "Connector Header Surface Mount 6 position 0.100\" (2.54mm)"
height 8.6
pads (3):
  rrect50% 2.73x1.27 smd: 1(1.365,2.54) 2(-1.365,0) 3(1.365,-2.54)
Top Overlay:
  circle w0.5: c2.262,3.88 r0.125
  lines w0.2: -1.4,-1 -1.4,-3.9 1.4,-3.9 1.4,-3.6 ; -1.4,1 -1.4,3.9 1.4,3.9 1.4,3.6 ; 1.4,-1.5 1.4,1.5
Mechanical 13:
  lines w0.1: -2.642,-3.78 -2.642,3.81 2.6,3.81 2.6,-3.78 -2.642,-3.78
Mechanical 15:
  lines w0.05: -3.1,-4.1 3.1,-4.1 3.1,4.1 -3.1,4.1 -3.1,-4.1
3D body "TSM-103-01-T-SV-TR.stp": height 9.65, standoff 0, extent -2.642,-3.81 2.642,3.81

## PLS-6 [mm] "Connector Header Through Hole 6 position 0.100\" (2.54mm)"
height 8.6
pads (6):
  rect 1.5x1.5 hole 1: 1(-6.35,0)
  round 1.5 hole 1: 2(-3.81,0) 3(-1.27,0) 4(1.27,0) 5(3.81,0) 6(6.35,0)
Top Overlay:
  circle w0.5: c-8.305,-0.83 r0.05
  lines w0.2: -7.62,-1.27 -7.62,1.27 7.625,1.27 7.625,-1.27 -7.62,-1.27
Mechanical 13:
  lines w0.1: -7.6,-1.2 7.6,-1.2 7.6,1.2 -7.6,1.2 -7.6,-1.2
Mechanical 15:
  lines w0.05: -7.62,1.245 -7.62,-1.27 ; -7.62,1.27 7.595,1.27 7.62,1.245 7.62,-1.265 7.625,-1.27 -7.62,-1.27 ; -7.62,-1.27 -7.62,-1.27
3D body "Header_Male_6Pin.STEP": height 8.54, standoff -3, extent -7.62,-1.245 7.62,1.245